# Altium footprint library Lib.PcbLib: 177 footprints (part 3 of 12)
Each footprint in its own frame and in the unit in brackets; x right, y up, seen from the top. Pads: shape width x height; smd on the part's side, far side on the other; paste and mask are expansions set on the pad; w line width, h text height; cw(c..) or ccw(c..) is an arc to the next point about the centre after c.
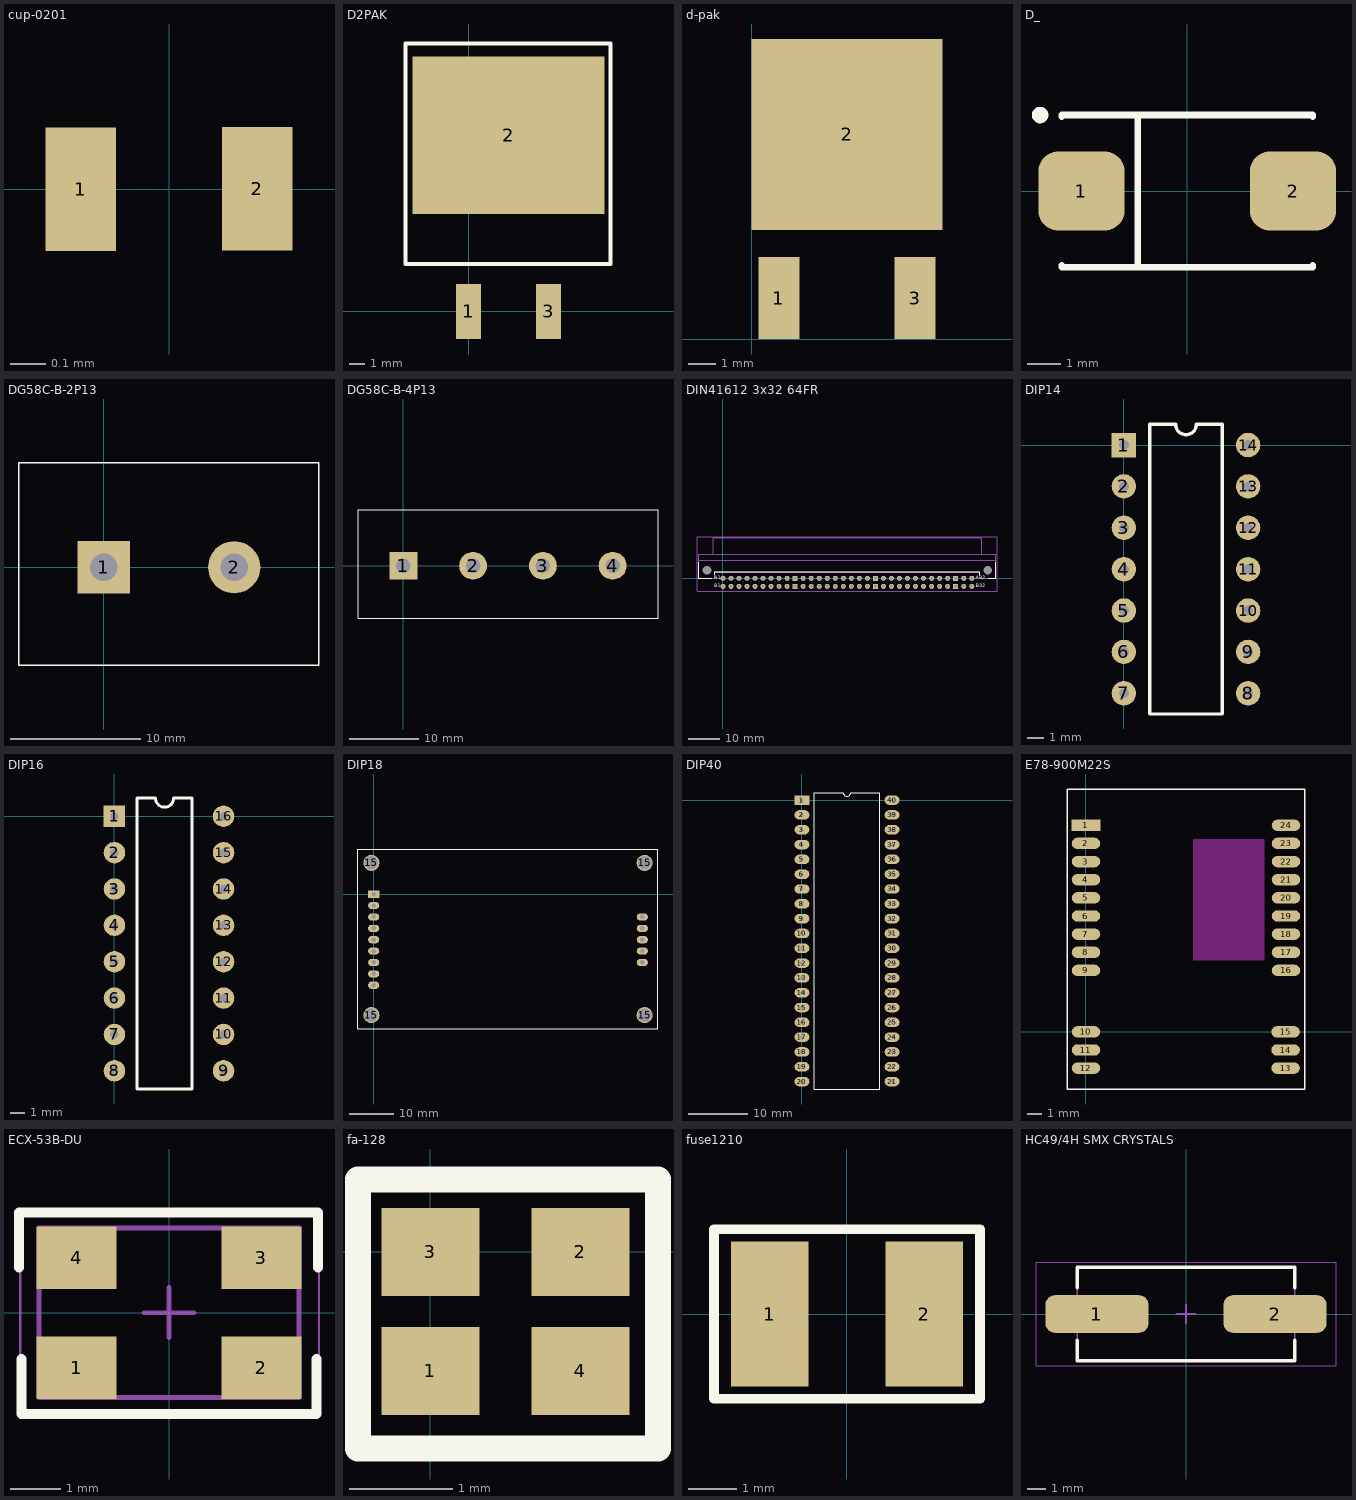
[diagram p2: the footprints below, top view; thin cyan lines are the x and y axes]

## cup-0201 [mm]
pads (2):
  rect 0.2x0.35 smd: 1(-0.25,0) 2(0.25,0)
3D body "User Library-SMD Ceramic Capacitors_0201 (0603)_AB.STEP": height 0.3, standoff 0, extent -0.3,-0.15 0.301,0.15

## D2PAK [mm]
pads (3):
  rect 1.6x3.5 smd: 1(0,0) 3(5.08,0)
  rect 12.2x10 smd: 2(2.54,11.2)
Top Overlay:
  lines w0.254: -4,3 -4,17 9,17 9,3 -4,3

## d-pak [mm]
pads (3):
  rect 1.5x3 smd: 1(1,1.5) 3(6,1.5)
  rect 7x7 smd: 2(3.5,7.5)
3D body "User Library-D-PAK.STEP": height 2.3, standoff 0, extent 0.254,0.75 6.747,10.25

## D_ [mm] "Capacitor, SM Tantalum; Body 7.3 x 4.3 mm (LxW typ)"
height 3.1
pads (2):
  rrect50% 2.6x2.4 smd: 1(-3.2,0) 2(3.2,0)
Top Overlay:
  circle w0.25: c-4.45,2.3 r0.125
  lines w0.2: -3.8,-2.25 -3.8,-2.3 3.8,-2.3 3.8,-2.25 ; -3.8,2.25 -3.8,2.3 3.8,2.3 3.8,2.25 ; -1.5,-2.3 -1.5,2.3
3D body "User Library-CaseD_7343-31.STEP": height 2.8, standoff 0, extent -3.65,-2.15 3.65,2.15

## DG58C-B-2P13 [mm]
pads (2):
  rect 4x4 hole 2.1: 1(0,0)
  round 4 hole 2.1: 2(10,0)
Top Overlay:
  lines w0.1: -6.5,-7.5 -6.5,8 16.5,8 16.5,-7.5 -6.5,-7.5
3D body: height 20, standoff 0, extent -6.5,-7.5 16.5,7.8
3D body: height 4.98, standoff -2.5, extent 3.5,3 3.5,3
3D body: height 4.98, standoff -2.5, extent 4.25,3.25 4.25,3.25

## DG58C-B-4P13 [mm]
pads (4):
  rect 4x4 hole 2.1: 1(0,0)
  round 4 hole 2.1: 2(10,0) 3(20,0) 4(30,0)
Top Overlay:
  lines w0.1: -6.5,-7.5 -6.5,8 36.5,8 36.5,-7.5 -6.5,-7.5
3D body: height 4.98, standoff -2.5, extent 3.5,3 3.5,3
3D body: height 4.98, standoff -2.5, extent 4.25,3.25 4.25,3.25

## DIN41612 3x32 64FR [mm] "96-Pin DIN Standard Right Angle Male PCB Mount Connector Розетка"
height 9.5
pads (66):
  round 0 hole 2.8 unplated mask+1.5: 0(-5.08,2.54) 0(83.82,2.54)
  round 1.6 hole 1: A1(0,0) A2(2.54,0) A3(5.08,0) A4(7.62,0) A5(10.16,0) A6(12.7,0) A7(15.24,0) A8(17.78,0) A9(20.32,0) A11(25.4,0) A12(27.94,0) A13(30.48,0) A14(33.02,0) A15(35.56,0) A16(38.1,0) A17(40.64,0) A18(43.18,0) A19(45.72,0) A21(50.8,0) A22(53.34,0) A23(55.88,0) A24(58.42,0) A25(60.96,0) A26(63.5,0) A27(66.04,0) A28(68.58,0) A29(71.12,0) A31(76.2,0) A32(78.74,0) B1(0,-2.54) B2(2.54,-2.54) B3(5.08,-2.54) B4(7.62,-2.54) B5(10.16,-2.54) B6(12.7,-2.54) B7(15.24,-2.54) B8(17.78,-2.54) B9(20.32,-2.54) B11(25.4,-2.54) B12(27.94,-2.54) B13(30.48,-2.54) B14(33.02,-2.54) B15(35.56,-2.54) B16(38.1,-2.54) B17(40.64,-2.54) B18(43.18,-2.54) B19(45.72,-2.54) B21(50.8,-2.54) B22(53.34,-2.54) B23(55.88,-2.54) B24(58.42,-2.54) B25(60.96,-2.54) B26(63.5,-2.54) B27(66.04,-2.54) B28(68.58,-2.54) B29(71.12,-2.54) B31(76.2,-2.54) B32(78.74,-2.54)
  rect 1.6x1.6 hole 1: A10(22.86,0) A20(48.26,0) A30(73.66,0) B10(22.86,-2.54) B20(48.26,-2.54) B30(73.66,-2.54)
Top Overlay:
  lines w0.2: -7.62,5 -7.62,0 -3.6,0 ; -2.54,1.06 -2.54,2 81.28,2 81.28,0.92 ; 84,0 86.36,0 86.36,5
  text "B32" at 80,-3.3 h2
  text "A32" at 80,-0.75 h2
  text "B1" at -2.8,-3.3 h2
  text "A1" at -2.8,-0.75 h2
Bottom Overlay:
  lines w0.2: -7.62,5 -7.62,0 -2.54,0 -2.54,-4.061 81.28,-4.061 81.28,0 86.36,0 86.36,5
Mechanical 3:
  lines w0.254: -7.625,0 -2.525,0 ; -7.62,0.025 -7.62,7.525 ; -7.62,5.7 86.36,5.7 ; -7.605,7.55 -3.125,7.55 ; -3.125,7.575 -3.125,12.75 81.85,12.75 81.85,7.55 86.36,7.55 ; -2.555,1.975 81.25,1.975 ; -2.55,0 -2.55,1.975 ; 81.275,0 81.275,1.95 ; 81.3,0 86.3,0 ; 86.36,0 86.36,7.505
Mechanical 13:
  lines w0.2: -7.62,5.7 86.36,5.7 ; -7.62,7.54 -7.62,0 -2.54,0 -2.54,2 81.28,2 81.28,0 86.36,0 86.36,7.54 81.85,7.54 ; -7.6,7.54 -3.125,7.54 ; -3.125,7.54 -3.125,12.75 81.85,12.75 81.85,7.54 ; -3.125,7.54 81.85,7.54
Mechanical 15:
  lines w0.05: -8.2,-4.028 -8.2,13.1 86.725,13.1 86.725,-4.028 -8.2,-4.028
  lines w0.1: -0.5,0.025 0.5,0.025 ; 0,-0.5 0,0.5
3D body "din_41612_male_b-64abr.stp": height 7.4, standoff -2.9, extent -7.484,-2.845 86.516,12.725

## DIP14 [mm]
pads (14):
  rect 1.5x1.5 hole 0.6: 1(0,0)
  round 1.5 hole 0.6: 2(0,-2.54) 3(0,-5.08) 4(0,-7.62) 5(0,-10.16) 6(0,-12.7) 7(0,-15.24) 8(7.62,-15.24) 9(7.62,-12.7) 10(7.62,-10.16) 11(7.62,-7.62) 12(7.62,-5.08) 13(7.62,-2.54) 14(7.62,0)
Top Overlay:
  lines w0.2: 1.585,-16.51 6.035,-16.51 6.035,1.27 4.445,1.27 cw(c3.81,1.27) 3.175,1.27 1.585,1.27 1.585,-16.51
3D body "SW3DPS-DIP14-DEFAULT.STEP": height 4.19, standoff -2.67, extent 0,-17.145 7.874,1.905

## DIP16 [mm]
pads (16):
  rect 1.5x1.5 hole 0.6: 1(0,0)
  round 1.5 hole 0.6: 2(0,-2.54) 3(0,-5.08) 4(0,-7.62) 5(0,-10.16) 6(0,-12.7) 7(0,-15.24) 8(0,-17.78) 9(7.62,-17.78) 10(7.62,-15.24) 11(7.62,-12.7) 12(7.62,-10.16) 13(7.62,-7.62) 14(7.62,-5.08) 15(7.62,-2.54) 16(7.62,0)
Top Overlay:
  lines w0.2: 1.585,-19.05 1.585,1.27 2.865,1.27 ccw(c3.5,1.27) 4.135,1.27 5.415,1.27 5.415,-19.05 1.585,-19.05
3D body "SW3DPS-DIP16-DEFAULT.STEP": height 4.19, standoff -2.57, extent -0.199,-19.67 7.675,1.92

## DIP18 [mm]
pads (18):
  rect 2.5x1.6 hole 1: 1(0,0)
  oval 2.5x1.6 hole 1: 2(0,-2.54) 3(0,-5.08) 4(0,-7.62) 5(0,-10.16) 6(0,-12.7) 7(0,-15.24) 8(0,-17.78) 9(0,-20.32) 10(60,-15.24) 11(60,-12.7) 12(60,-10.16) 13(60,-7.62) 14(60,-5.08)
  round 3.6 hole 3: 15(-0.5,-27) 15(-0.5,7) 15(60.5,-27) 15(60.5,7)
Top Overlay:
  lines w0.2: -3.5,-30 63.5,-30 63.5,10 21.365,10 -3.5,10 -3.5,-30

## DIP40 [mm]
pads (40):
  rect 2.5x1.6 hole 0.6: 1(0,0)
  oval 2.5x1.6 hole 0.6: 2(0,-2.5) 3(0,-5) 4(0,-7.5) 5(0,-10) 6(0,-12.5) 7(0,-15) 8(0,-17.5) 9(0,-20) 10(0,-22.5) 11(0,-25) 12(0,-27.5) 13(0,-30) 14(0,-32.5) 15(0,-35) 16(0,-37.5) 17(0,-40) 18(0,-42.5) 19(0,-45) 20(0,-47.5) 21(15.2,-47.5) 22(15.2,-45) 23(15.2,-42.5) 24(15.2,-40) 25(15.2,-37.5) 26(15.2,-35) 27(15.2,-32.5) 28(15.2,-30) 29(15.2,-27.5) 30(15.2,-25) 31(15.2,-22.5) 32(15.2,-20) 33(15.2,-17.5) 34(15.2,-15) 35(15.2,-12.5) 36(15.2,-10) 37(15.2,-7.5) 38(15.2,-5) 39(15.2,-2.5) 40(15.2,0)
Top Overlay:
  lines w0.2: 2.085,-48.75 2.085,1.25 6.975,1.25 ccw(c7.6,1.25) 8.225,1.25 13.115,1.25 13.115,-48.75 2.085,-48.75

## E78-900M22S [mm]
pads (24):
  rect 2x0.8 smd: 1(0,14.46)
  oval 2x0.8 smd: 2(0,13.19) 3(0,11.92) 4(0,10.65) 5(0,9.38) 6(0,8.11) 7(0,6.84) 8(0,5.57) 9(0,4.3) 10(0,0) 11(0,-1.27) 12(0,-2.54) 13(13.97,-2.54) 14(13.97,-1.27) 15(13.97,0) 16(14,4.3) 17(14,5.57) 18(14,6.84) 19(14,8.11) 20(14,9.38) 21(14,10.65) 22(14,11.92) 23(14,13.19) 24(14,14.46)
Top Overlay:
  lines w0.1: -1.3,-4 15.3,-4 15.3,17 -1.3,17 -1.3,-4
Keep-Out Layer:
  rectangle: 7.5,5 12.5,13.5
3D body: height 3, standoff 0.2, extent 0,-3.5 14,16.5
3D body: height 4.98, standoff -2.5, extent 21.4,3 21.4,3

## ECX-53B-DU [mm] "SMX crystals"
height 4.3
pads (4):
  rect 1.6x1.25 smd: 1(-1.85,-1.1) 2(1.85,-1.1) 3(1.85,1.1) 4(-1.85,1.1)
Top Overlay:
  lines w0.2: -3,0.9 -3,2 2.975,2 2.975,0.9 ; -2.95,-0.925 -2.95,-2.025 2.95,-2.025 2.95,-0.925
Mechanical 13:
  lines w0.1: -2.6,-1.7 -2.6,1.7 2.6,1.7 2.6,-1.7 -2.6,-1.7
Mechanical 15:
  lines w0.05: -2.975,-2.05 -2.975,2 3,2 3,-2.05 -2.975,-2.05
  lines w0.1: -0.5,0 0.5,0 ; 0,-0.5 0,0.5
3D body "User Library-XTAL_ecx-53b.step": height 0.85, standoff 0, extent -2.5,-1.6 2.5,1.6

## fa-128 [mm]
height 0.5
pads (4):
  rect 0.95x0.85 smd paste+0: 1(0,-1.15)
  rect 0.95x0.85 smd: 2(1.45,0) 3(0,0) 4(1.45,-1.15)
Top Overlay:
  lines w0.254: -0.7,-1.9 -0.7,0.7 2.2,0.7 2.2,-1.9 -0.7,-1.9
3D body: height 0.5, standoff 0, extent -0.3,-1.4 1.7,0.2

## fuse1210 [mm]
pads (2):
  rect 1.6x3 smd: 1(-1.6,0) 2(1.6,0)
Top Overlay:
  lines w0.2: -2.75,-1.75 -2.75,1.75 2.75,1.75 2.75,-1.75 -2.75,-1.75
3D body "User Library-Fuse1210.STEP": height 0.67, standoff 0, extent -1.6,-1.287 1.615,1.287

## HC49/4H SMX CRYSTALS [mm] "SMX crystals"
height 4.3
pads (2):
  rrect50% 5.5x2 smd: 1(-4.75,0) 2(4.75,0)
Top Overlay:
  lines w0.2: -5.8,-1.4 -5.8,-2.5 5.8,-2.5 5.8,-1.4 ; -5.8,1.4 -5.8,2.5 5.8,2.5 5.8,1.4
Mechanical 13:
  lines w0.1: -5.8,-2.45 -5.8,2.45 5.8,2.45 5.8,-2.45 -5.8,-2.45
Mechanical 15:
  lines w0.05: -8,-2.75 -8,2.75 8,2.75 8,-2.75 -8,-2.75
  lines w0.1: -0.5,0 0.5,0 ; 0,-0.5 0,0.5
3D body: height 4.3, standoff 0, extent -5.8,-2.45 5.8,2.45